# Altium footprint library UWRT Footprint Library.PcbLib: 258 footprints (part 3 of 17)
Each footprint in its own frame and in the unit in brackets; x right, y up, seen from the top. Pads: shape width x height; smd on the part's side, far side on the other; paste and mask are expansions set on the pad; w line width, h text height; cw(c..) or ccw(c..) is an arc to the next point about the centre after c.
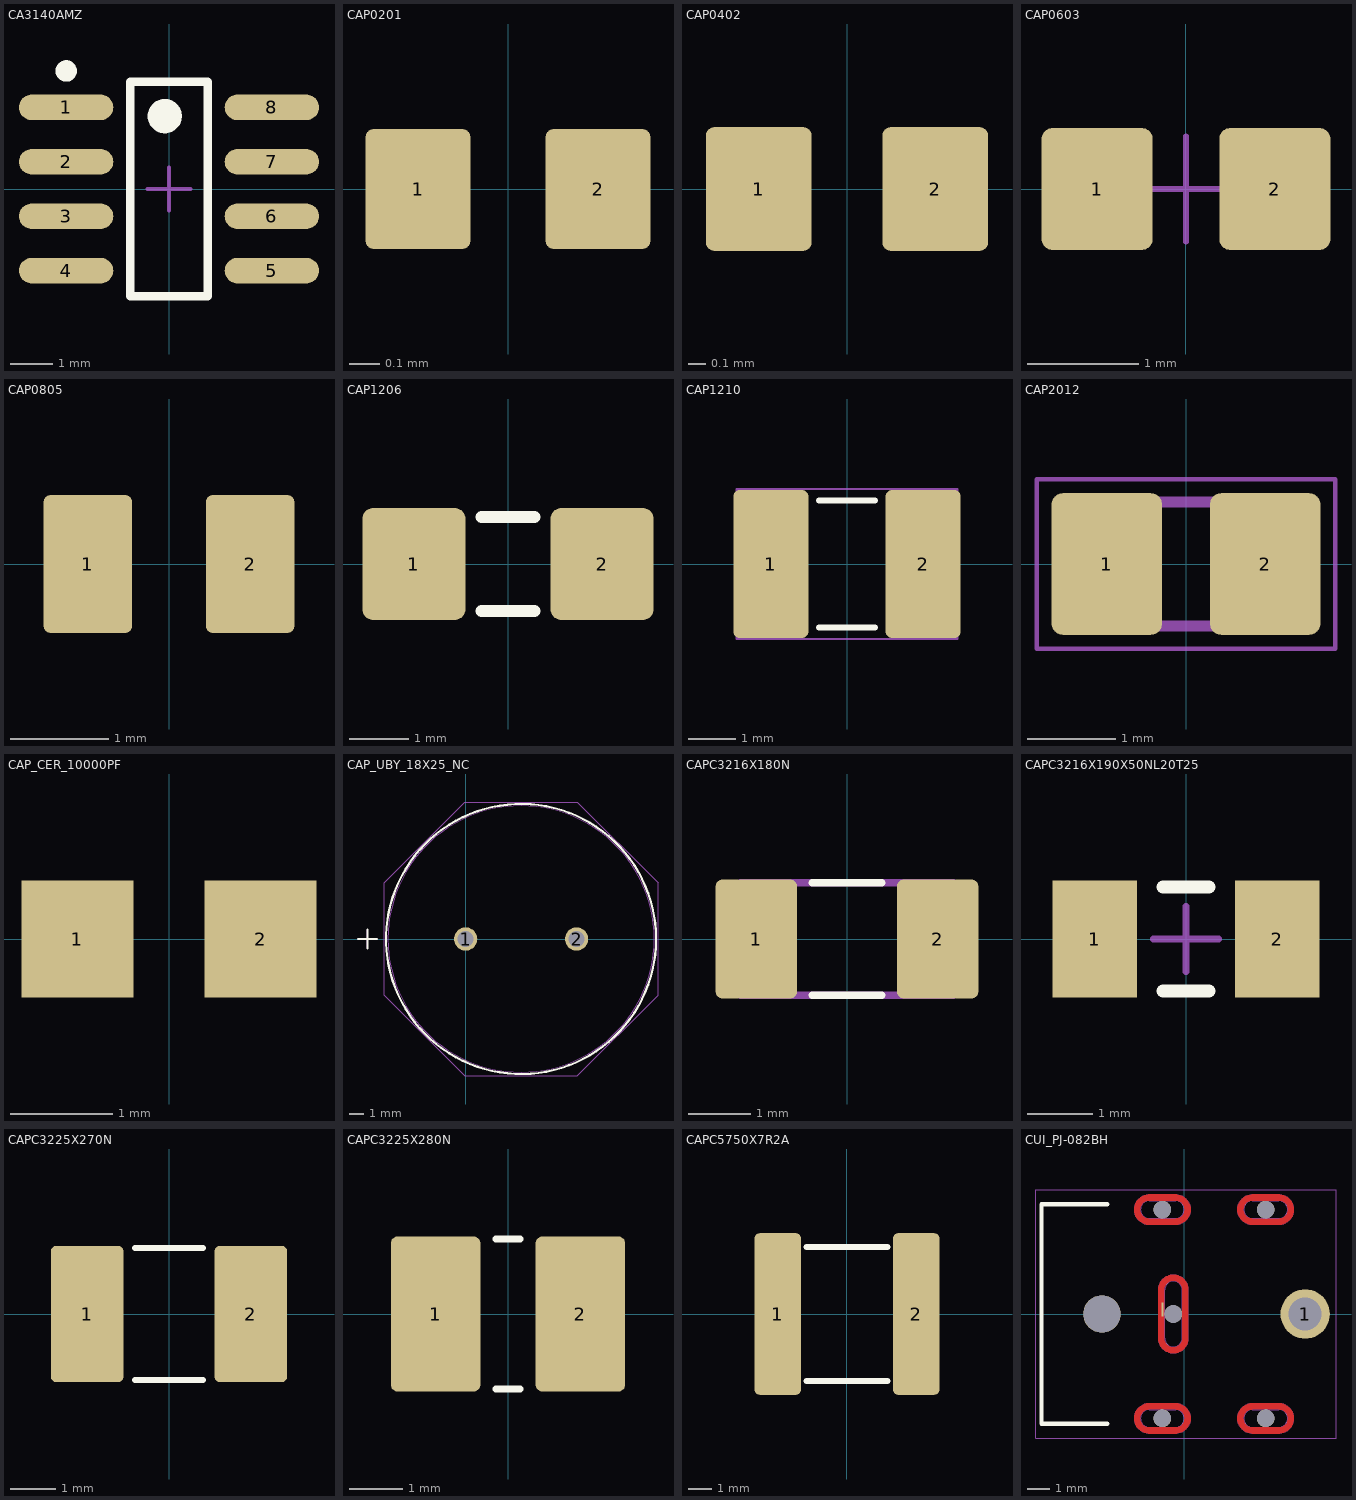
[diagram p2: the footprints below, top view; thin cyan lines are the x and y axes]

## CA3140AMZ [mm]
pads (8):
  oval 2.2x0.6 smd: 1(-2.4,1.905) 2(-2.4,0.635) 3(-2.4,-0.635) 4(-2.4,-1.905) 5(2.4,-1.905) 6(2.4,-0.635) 7(2.4,0.635) 8(2.4,1.905)
Top Overlay:
  circle w0.4: c-0.1,1.7 r0.2
  circle w0.25: c-2.4,2.755 r0.125
  lines w0.2: -0.9,-2.5 0.9,-2.5 0.9,2.5 -0.9,2.5 -0.9,-2.5
Mechanical 15:
  lines w0.1: -0.5,0 0.5,0 ; 0,-0.5 0,0.5
3D body: height 1.75, standoff 0.1, extent -2,-2.5 2,2.5

## CAP0201 [mm] "Chip Capacitor, Body 0.6x0.3mm, Height 0.25mm, IPC Medium Density"
pads (2):
  rrect15% 0.35x0.4 smd: 1(-0.3,0) 2(0.3,0)
3D body "CAP0201.SLDPRT": height 0.3, standoff 0, extent -0.3,-0.15 0.3,0.15

## CAP0402 [mm] "Chip Capacitor, Body 1x0.5mm, Height 0.35mm, IPC Medium Density"
pads (2):
  rrect15% 0.6x0.7 smd: 1(-0.5,0) 2(0.5,0)
3D body "CAP0402.stp": height 0.54, standoff -0.01, extent -0.525,-0.275 0.525,0.275

## CAP0603 [mm]
height 0.55
pads (2):
  rrect20% 1x1.1 smd: 1(-0.8,0) 2(0.8,0)
Mechanical 13:
  lines w0.1: -0.875,-0.475 -0.875,0.475 ; 0.875,-0.475 0.875,0.475
Mechanical 15:
  lines w0.05: -0.475,0 0.475,0 ; 0,-0.475 0,0.475
3D body: height 0.55, standoff 0, extent -0.875,-0.475 -0.525,0.475
3D body: height 0.55, standoff 0, extent 0.525,-0.475 0.875,0.475
3D body "c0603c101j1gactu.stp": height 0.87, standoff 0, extent -0.875,-0.475 0.875,0.475

## CAP0805 [mm] "Chip Capacitor, Body 2.0x1.2mm, Height 0.45mm, IPC Medium Density"
pads (2):
  rrect15% 0.9x1.4 smd: 1(-0.825,0) 2(0.825,0)
3D body "CAP0805.stp": height 1.39, standoff -0.01, extent -1.1,-0.725 1.1,0.725

## CAP1206 [mm] "Chip Capacitor, Body 3.2x1.6mm, Height 0.55mm, IPC Medium Density"
height 0.55
pads (2):
  rrect20% 1.75x1.9 smd: 1(-1.6,0) 2(1.6,0)
Top Overlay:
  lines w0.2: -0.45,-0.8 0.45,-0.8 ; -0.45,0.8 0.45,0.8
3D body "1206.stp": height 0.88, standoff 0, extent -1.7,-0.9 1.7,0.9

## CAP1210 [mm]
pads (2):
  rrect15% 1.6x3.15 smd: 1(-1.625,0) 2(1.625,0)
Top Overlay:
  lines w0.127: -0.6,-1.35 0.6,-1.35 ; -0.6,1.35 0.6,1.35
Mechanical 15:
  lines w0.05: -2.355,-1.6 -2.355,1.6 2.355,1.6 2.355,-1.6 -2.355,-1.6
3D body "c1210c106k3pactu.stp": height 2.1, standoff 0, extent -1.7,-1.35 1.7,1.35

## CAP2012 [mm]
pads (2):
  rrect20% 1.25x1.6 smd: 1(-0.895,0) 2(0.895,0)
Mechanical 4:
  lines w0.127: -1.07,-0.7 1.07,-0.7 ; -1.07,-0.7 -1.07,0.7 ; -1.07,-0.7 1.07,-0.7 ; -1.07,-0.7 -1.07,0.7 ; -1.07,0.7 1.07,0.7 ; -1.07,0.7 1.07,0.7 ; 1.07,-0.7 1.07,0.7 ; 1.07,-0.7 1.07,0.7
Mechanical 15:
  lines w0.05: -1.685,-0.96 1.685,-0.96 1.685,0.96 -1.685,0.96 -1.685,-0.96
3D body "c0805c100jdgactu.stp": height 1.41, standoff 0.01, extent -1.1,-0.7 1.1,0.75

## CAP_CER_10000PF [mm] "CAP CER 10000PF 200V X7R 0603"
pads (2):
  rect 1.1x1.15 smd: 1(-0.9,0) 2(0.9,0)
3D body "C0603C103K2RECTU.step": height 0.96, standoff 0.01, extent -0.9,-0.445 0.85,0.425

## CAP_UBY_18X25_NC [mil]
pads (2):
  round 62 hole 42 mask+0: 1(0,0) 2(295.28,0)
Top Overlay:
  circle w6: c147.64,0 r359.5
  lines w6: -286.55,0 -236.55,0 ; -261.55,-25 -261.55,25
Mechanical 13:
  circle w0: c147.64,0 r354.5
  lines w1: -261.55,-25 -261.55,25
Mechanical 15:
  lines w1: -216.86,-150.09 -216.86,150.09 -2.45,364.5 297.73,364.5 512.14,150.09 512.14,-150.09 297.73,-364.5 -2.45,-364.5 -216.86,-150.09
3D body: height 10, standoff 0, extent 0,0 10,10
3D body "CAP_UBY_18X25_NCH.step": height 1043.62, standoff -195.98, extent -207.46,-354.34 502.14,354.35

## CAPC3216X180N [mm]
pads (2):
  rrect15% 1.3x1.9 smd: 1(-1.45,0) 2(1.45,0)
Top Overlay:
  lines w0.127: -0.55,-0.9 0.55,-0.9 ; -0.55,0.9 0.55,0.9
Mechanical 4:
  lines w0.127: -1.7,-0.9 1.7,-0.9 ; -1.7,-0.9 -1.7,0.9 ; -1.7,-0.9 1.7,-0.9 ; -1.7,-0.9 -1.7,0.9 ; -1.7,0.9 1.7,0.9 ; -1.7,0.9 1.7,0.9 ; 1.7,-0.9 1.7,0.9 ; 1.7,-0.9 1.7,0.9
3D body "GJ831CR71H475KA12L--3DModel-STEP-46669.STEP": height 1.59, standoff -0.01, extent -1.6,-0.9 1.6,0.9

## CAPC3216X190X50NL20T25 [mm] "Chip Capacitor, 2-Leads, Body 3.20x1.60mm, IPC Medium Density"
height 1.9
pads (2):
  rect 1.3x1.8 smd: 1(-1.4,0) 2(1.4,0)
Top Overlay:
  lines w0.2: -0.35,-0.8 0.35,-0.8 ; -0.35,0.8 0.35,0.8
Mechanical 15:
  lines w0.1: -0.5,0 0.5,0 ; 0,-0.5 0,0.5
3D body "GJ831CR71H475KA12L--3DModel-STEP-46669.STEP": height 1.59, standoff -0.01, extent -1.6,-0.9 1.6,0.9

## CAPC3225X270N [mm]
pads (2):
  rrect15% 1.6x3 smd: 1(-1.8,0) 2(1.8,0)
Top Overlay:
  lines w0.127: -0.75,-1.45 0.75,-1.45 ; -0.75,1.45 0.75,1.45
3D body "GRT32EC81C476KE13L--3DModel-STEP-56544.STEP": height 2.55, standoff 0.05, extent -1.6,-1.35 1.6,1.35

## CAPC3225X280N [mm]
pads (2):
  rrect15% 1.675x2.9 smd: 1(-1.353,0) 2(1.353,0)
Top Overlay:
  lines w0.127: -0.23,-1.4 0.23,-1.4 ; -0.23,1.4 0.23,1.4
3D body "User Library-CAPC3225X13.step": height 1.3, standoff 0, extent -1.6,-1.25 1.6,1.25

## CAPC5750X7R2A [mm]
pads (2):
  rrect20% 2x7 smd: 1(-3,0) 2(3,0)
Top Overlay:
  lines w0.254: -1.75,-2.905 1.75,-2.905 ; -1.75,2.905 1.75,2.905
3D body "2220.stp": height 2.7, standoff 0, extent -2.91,-2.7 3.19,2.7

## CUI_PJ-082BH [mm]
pads (8):
  round 2.25 hole 1.5: 1(5.5,0)
  rect 0.1x0.635 smd: 2(-1,0.2)
  round 1.7 hole 1.7 unplated: ""(-3.75,0)
  round 0.8 hole 0.8 unplated: ""(-1,-4.75) ""(-1,4.75) ""(-0.5,0) ""(3.7,-4.75) ""(3.7,4.75)
Top Layer:
  lines w0.3: -2.15,-4.75 ccw(c-1.6,-4.75) -1.6,-5.3 -0.4,-5.3 ccw(c-0.4,-4.75) 0.15,-4.75 ccw(c-0.4,-4.75) -0.4,-4.2 -1.6,-4.2 ccw(c-1.6,-4.75) -2.15,-4.75 ; -2.15,4.75 ccw(c-1.6,4.75) -1.6,4.2 -0.4,4.2 ccw(c-0.4,4.75) 0.15,4.75 ccw(c-0.4,4.75) -0.4,5.3 -1.6,5.3 ccw(c-1.6,4.75) -2.15,4.75 ; -1.05,-1.1 ccw(c-0.5,-1.1) -0.5,-1.65 ccw(c-0.5,-1.1) 0.05,-1.1 0.05,1.1 ccw(c-0.5,1.1) -0.5,1.65 ccw(c-0.5,1.1) -1.05,1.1 -1.05,-1.1 ; 2.55,-4.75 ccw(c3.1,-4.75) 3.1,-5.3 4.3,-5.3 ccw(c4.3,-4.75) 4.85,-4.75 ccw(c4.3,-4.75) 4.3,-4.2 3.1,-4.2 ccw(c3.1,-4.75) 2.55,-4.75 ; 2.55,4.75 ccw(c3.1,4.75) 3.1,4.2 4.3,4.2 ccw(c4.3,4.75) 4.85,4.75 ccw(c4.3,4.75) 4.3,5.3 3.1,5.3 ccw(c3.1,4.75) 2.55,4.75
Bottom Layer:
  lines w0.3: -2.15,-4.75 ccw(c-1.6,-4.75) -1.6,-5.3 -0.4,-5.3 ccw(c-0.4,-4.75) 0.15,-4.75 ccw(c-0.4,-4.75) -0.4,-4.2 -1.6,-4.2 ccw(c-1.6,-4.75) -2.15,-4.75 ; -2.15,4.75 ccw(c-1.6,4.75) -1.6,4.2 -0.4,4.2 ccw(c-0.4,4.75) 0.15,4.75 ccw(c-0.4,4.75) -0.4,5.3 -1.6,5.3 ccw(c-1.6,4.75) -2.15,4.75 ; -1.05,-1.1 ccw(c-0.5,-1.1) -0.5,-1.65 ccw(c-0.5,-1.1) 0.05,-1.1 0.05,1.1 ccw(c-0.5,1.1) -0.5,1.65 ccw(c-0.5,1.1) -1.05,1.1 -1.05,-1.1 ; 2.55,-4.75 ccw(c3.1,-4.75) 3.1,-5.3 4.3,-5.3 ccw(c4.3,-4.75) 4.85,-4.75 ccw(c4.3,-4.75) 4.3,-4.2 3.1,-4.2 ccw(c3.1,-4.75) 2.55,-4.75 ; 2.55,4.75 ccw(c3.1,4.75) 3.1,4.2 4.3,4.2 ccw(c4.3,4.75) 4.85,4.75 ccw(c4.3,4.75) 4.3,5.3 3.1,5.3 ccw(c3.1,4.75) 2.55,4.75
Top Overlay:
  lines w0.2: -3.5,-5 -6.5,-5 -6.5,5 -3.5,5
Top Paste:
  lines w0.3: -2.15,-4.75 ccw(c-1.6,-4.75) -1.6,-5.3 -0.4,-5.3 ccw(c-0.4,-4.75) 0.15,-4.75 ccw(c-0.4,-4.75) -0.4,-4.2 -1.6,-4.2 ccw(c-1.6,-4.75) -2.15,-4.75 ; -2.15,4.75 ccw(c-1.6,4.75) -1.6,4.2 -0.4,4.2 ccw(c-0.4,4.75) 0.15,4.75 ccw(c-0.4,4.75) -0.4,5.3 -1.6,5.3 ccw(c-1.6,4.75) -2.15,4.75 ; -1.05,-1.1 ccw(c-0.5,-1.1) -0.5,-1.65 ccw(c-0.5,-1.1) 0.05,-1.1 0.05,1.1 ccw(c-0.5,1.1) -0.5,1.65 ccw(c-0.5,1.1) -1.05,1.1 -1.05,-1.1 ; 2.55,-4.75 ccw(c3.1,-4.75) 3.1,-5.3 4.3,-5.3 ccw(c4.3,-4.75) 4.85,-4.75 ccw(c4.3,-4.75) 4.3,-4.2 3.1,-4.2 ccw(c3.1,-4.75) 2.55,-4.75 ; 2.55,4.75 ccw(c3.1,4.75) 3.1,4.2 4.3,4.2 ccw(c4.3,4.75) 4.85,4.75 ccw(c4.3,4.75) 4.3,5.3 3.1,5.3 ccw(c3.1,4.75) 2.55,4.75
Bottom Paste:
  lines w0.3: -2.15,-4.75 ccw(c-1.6,-4.75) -1.6,-5.3 -0.4,-5.3 ccw(c-0.4,-4.75) 0.15,-4.75 ccw(c-0.4,-4.75) -0.4,-4.2 -1.6,-4.2 ccw(c-1.6,-4.75) -2.15,-4.75 ; -2.15,4.75 ccw(c-1.6,4.75) -1.6,4.2 -0.4,4.2 ccw(c-0.4,4.75) 0.15,4.75 ccw(c-0.4,4.75) -0.4,5.3 -1.6,5.3 ccw(c-1.6,4.75) -2.15,4.75 ; -1.05,-1.1 ccw(c-0.5,-1.1) -0.5,-1.65 ccw(c-0.5,-1.1) 0.05,-1.1 0.05,1.1 ccw(c-0.5,1.1) -0.5,1.65 ccw(c-0.5,1.1) -1.05,1.1 -1.05,-1.1 ; 2.55,-4.75 ccw(c3.1,-4.75) 3.1,-5.3 4.3,-5.3 ccw(c4.3,-4.75) 4.85,-4.75 ccw(c4.3,-4.75) 4.3,-4.2 3.1,-4.2 ccw(c3.1,-4.75) 2.55,-4.75 ; 2.55,4.75 ccw(c3.1,4.75) 3.1,4.2 4.3,4.2 ccw(c4.3,4.75) 4.85,4.75 ccw(c4.3,4.75) 4.3,5.3 3.1,5.3 ccw(c3.1,4.75) 2.55,4.75
Top Solder:
  drawing of 5 lines, arcs and shapes, not listed
Bottom Solder:
  drawing of 5 lines, arcs and shapes, not listed
Mechanical 1:
  lines w0.001: -2,-4.75 ccw(c-1.6,-4.75) -1.6,-5.15 -0.4,-5.15 ccw(c-0.4,-4.75) 0,-4.75 ccw(c-0.4,-4.75) -0.4,-4.35 -1.6,-4.35 ccw(c-1.6,-4.75) -2,-4.75 ; -2,4.75 ccw(c-1.6,4.75) -1.6,4.35 -0.4,4.35 ccw(c-0.4,4.75) 0,4.75 ccw(c-0.4,4.75) -0.4,5.15 -1.6,5.15 ccw(c-1.6,4.75) -2,4.75 ; -0.9,-1.1 ccw(c-0.5,-1.1) -0.5,-1.5 ccw(c-0.5,-1.1) -0.1,-1.1 -0.1,1.1 ccw(c-0.5,1.1) -0.5,1.5 ccw(c-0.5,1.1) -0.9,1.1 -0.9,-1.1 ; 2.7,-4.75 ccw(c3.1,-4.75) 3.1,-5.15 4.3,-5.15 ccw(c4.3,-4.75) 4.7,-4.75 ccw(c4.3,-4.75) 4.3,-4.35 3.1,-4.35 ccw(c3.1,-4.75) 2.7,-4.75 ; 2.7,4.75 ccw(c3.1,4.75) 3.1,4.35 4.3,4.35 ccw(c4.3,4.75) 4.7,4.75 ccw(c4.3,4.75) 4.3,5.15 3.1,5.15 ccw(c3.1,4.75) 2.7,4.75
Mechanical 15:
  lines w0.05: -6.75,-5.65 6.9,-5.65 6.9,5.65 -6.75,5.65 -6.75,-5.65
3D body "CUI_DEVICES_PJ-082BH.step": height 10.15, standoff -2.05, extent -6.522,-5.125 6.608,5.075